# Altium footprint library Design III PCB Library.PcbLib: 89 footprints (part 6 of 6)
Each footprint in its own frame and in the unit in brackets; x right, y up, seen from the top. Pads: shape width x height; smd on the part's side, far side on the other; paste and mask are expansions set on the pad; w line width, h text height; cw(c..) or ccw(c..) is an arc to the next point about the centre after c.
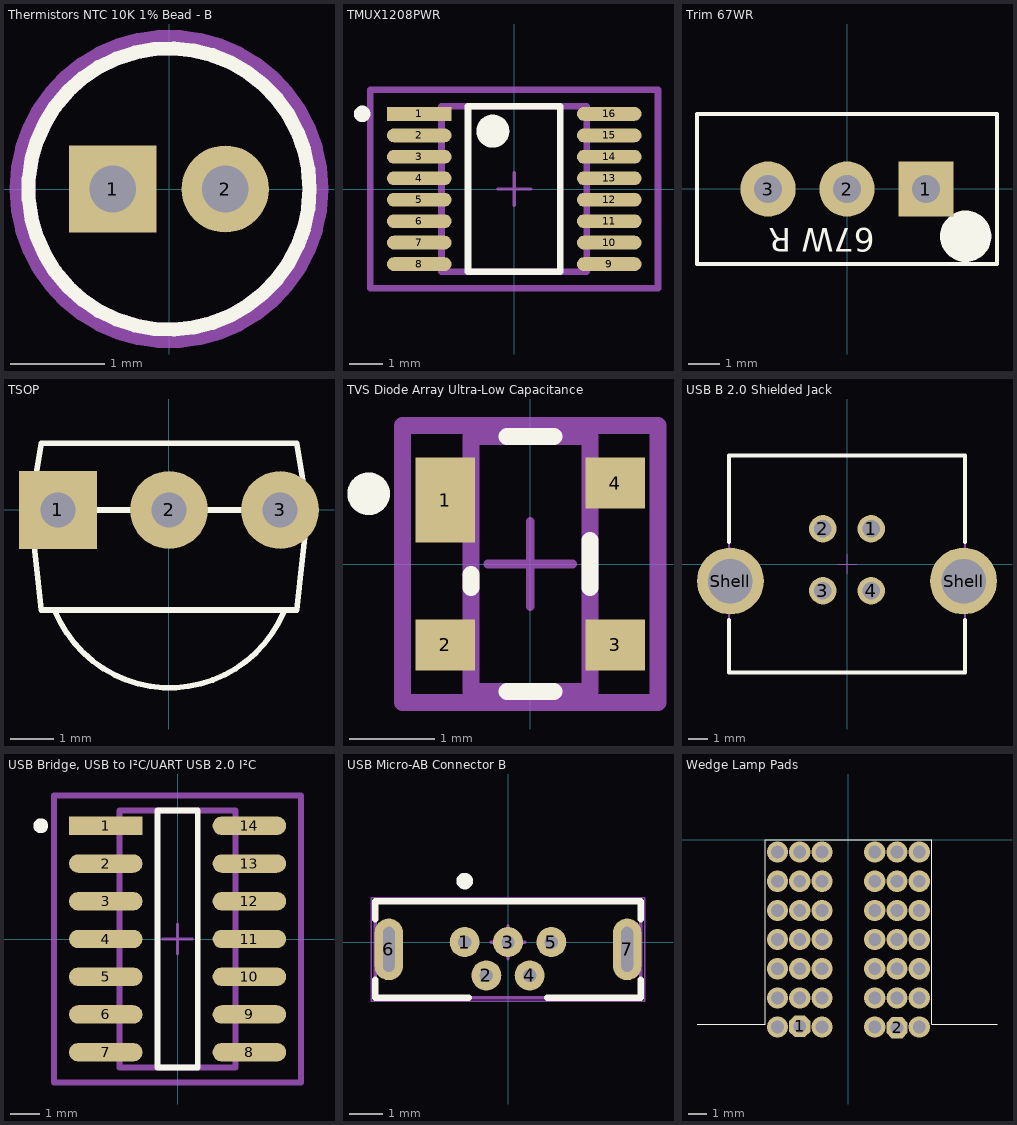
[diagram p5: the footprints below, top view; thin cyan lines are the x and y axes]

## Thermistors NTC 10K 1% Bead - B [mm] "NTC Thermistor 10k Bead, Epoxy"
pads (2):
  rect 0.93x0.93 hole 0.5 paste-1000 mask+0: 1(-0.6,0)
  round 0.93 hole 0.5 paste-1000 mask+0: 2(0.6,0)
Top Overlay:
  circle w0.15: c0,0 r1.5
Top 3D Body:
  circle w0.15: c0,0 r1.5
Top Courtyard:
  lines w0.2: -1.6,0 ccw(c0,0) 1.6,0 ccw(c0,0) -1.6,0

## TMUX1208PWR [mm] "5-V, 8: 1, 1-channel general-purpose analog multiplexer with 1.8-V input logic 16-TSSOP -40 to 125"
pads (16):
  rect 1.955x0.421 smd paste+0 mask+0: 1(-2.875,2.275)
  rrect100% 1.955x0.421 smd paste+0 mask+0: 2(-2.875,1.625) 3(-2.875,0.975) 4(-2.875,0.325) 5(-2.875,-0.325) 6(-2.875,-0.975) 7(-2.875,-1.625) 8(-2.875,-2.275) 9(2.875,-2.275) 10(2.875,-1.625) 11(2.875,-0.975) 12(2.875,-0.325) 13(2.875,0.325) 14(2.875,0.975) 15(2.875,1.625) 16(2.875,2.275)
Top Overlay:
  circle w0.5: c-0.648,1.75 r0.25
  circle w0.25: c-4.603,2.275 r0.125
  lines w0.2: -1.398,-2.5 1.398,-2.5 1.398,2.5 -1.398,2.5 -1.398,-2.5
Top Assembly:
  lines w0.2: -4.353,-3 4.353,-3 4.353,3 -4.353,3 -4.353,-3
Top Courtyard:
  lines w0.2: -4.353,-3 4.353,-3 4.353,3 -4.353,3 -4.353,-3
Board:
  lines w0.2: -2.2,-2.5 2.2,-2.5 2.2,2.5 -2.2,2.5 -2.2,-2.5
Top Component Center:
  lines w0.1: -0.5,0 0.5,0 ; 0,-0.5 0,0.5
3D body "IC_TEXAS_INSTRUMENTS_SN74HC165PWR_eec.STEP": height 0.25, standoff 0, extent -4.353,-3 4.353,3

## Trim 67WR [mil] "Trim 10T Vertical"
pads (3):
  rect 70x70 hole 35.4: 1(100,-0.29)
  round 70 hole 35.4: 2(0,-0.29) 3(-100,-0.29)
Top Overlay:
  circle w35: c150.32,-60.2 r15
  lines w5: -190,-95.29 -190,94.71 190,94.71 190,-95.29 -190,-95.29
  text "67W R" at 35,-50.29 h30
3D body: height 478, standoff 450, extent 110.32,-60.21 190.32,-50.21
3D body: height 476, standoff 6, extent 111.32,-94.13 189.01,-16.28
3D body: height 417, standoff 5, extent -190,-95.29 190,94.71

## TSOP [mil] "IR Sensor"
pads (3):
  rect 70x70 hole 31.5: 1(-99.75,-0.41)
  round 70 hole 31.5: 2(0.26,-0.41) 3(100.25,-0.41)
Top Overlay:
  lines w5: -102.19,-91.42 ccw(c0.81,-49.03) 103.65,-91.83 ; -124.74,-0.41 -62.24,-0.41 62.76,-0.41 125.26,-0.41 ; -124.74,-0.41 -114.74,-90.41 115.26,-90.41 125.26,-0.41 ; -124.74,-0.41 -114.74,59.59 115.26,59.59 125.26,-0.41
3D body: height 80, standoff -20, extent 85.28,-15.29 115.22,14.59
3D body: height 80, standoff -20, extent -14.72,-15.29 15.22,14.59
3D body: height 80, standoff -20, extent -114.72,-15.29 -84.78,14.59
3D body: height 290, standoff 110, extent -89.36,-159.47 89.87,19.59
3D body: height 330, standoff 50, extent -124.74,-90.41 125.26,59.59

## TVS Diode Array Ultra-Low Capacitance [mm] "Clamp Ipp Tvs Diode Surface Mount SOT-143B"
pads (4):
  rect 0.7x1 smd paste-1000 mask+0: 1(-1,0.75)
  rect 0.7x0.6 smd paste-1000 mask+0: 2(-1,-0.95) 3(1,-0.95) 4(1,0.95)
Top Overlay:
  circle w0.25: c-1.9,0.825 r0.125
  lines w0.2: -0.7,-0.275 -0.7,-0.125 ; -0.275,-1.5 0.275,-1.5 ; -0.275,1.5 0.275,1.5 ; 0.7,-0.275 0.7,0.275
Top Paste:
  rectangle: 0.7,0.7 1.3,1.2
  rectangle: 0.7,-1.2 1.3,-0.7
  rectangle: -1.3,-1.2 -0.7,-0.7
  rectangle: -1.3,0.3 -0.7,1.2
Top Assembly:
  lines w0.2: -1.5,-1.625 -1.5,1.625 1.5,1.625 1.5,-1.625 -1.5,-1.625
Top Courtyard:
  lines w0.2: -1.5,-1.625 -1.5,1.625 1.5,1.625 1.5,-1.625 -1.5,-1.625
Board:
  lines w0.2: -0.7,-1.5 -0.7,1.5 0.7,1.5 0.7,-1.5 -0.7,-1.5
Top Component Center:
  lines w0.1: -0.5,0 0.5,0 ; 0,-0.5 0,0.5
3D body "Trans_Nexperia_BCM62B_215_eec.STEP": height 0.25, standoff 0, extent -1.5,-1.625 1.5,1.625

## USB B 2.0 Shielded Jack [mm] "Straight PCB Mount Mount Female Type B USB Connector; 30 V ac; 1.5A"
pads (6):
  round 1.42 hole 0.92: 1(1.25,1.82) 2(-1.25,1.82) 3(-1.25,-1.38) 4(1.25,-1.38)
  round 3.45 hole 2.3: Shell(-6.02,-0.88) Shell(6.02,-0.88)
Top Overlay:
  lines w0.2: -6.1,-2.9 -6.1,-5.6 6.1,-5.6 6.1,-2.9 ; -6.1,1.14 -6.1,5.6 6.1,5.6 6.1,1.14
Mechanical 13:
  lines w0.1: -6.1,-5.6 -6.1,5.6 6.1,5.6 6.1,-5.6 -6.1,-5.6
Mechanical 15:
  lines w0.05: -0.5,0 0.5,0 ; 0,-0.5 0,0.5
3D body "61400413321.stp": height 16.14, standoff -4.18, extent -7.35,-5.6 7.35,5.6

## USB Bridge, USB to I²C/UART USB 2.0 I²C [mm] "USB Bridge, USB to I²C/UART USB 2.0 I²C, UART Interface 14-SOIC"
pads (14):
  rect 2.474x0.622 smd paste+0 mask+0: 1(-2.416,3.81)
  rrect100% 2.474x0.622 smd paste+0 mask+0: 2(-2.416,2.54) 3(-2.416,1.27) 4(-2.416,0) 5(-2.416,-1.27) 6(-2.416,-2.54) 7(-2.416,-3.81) 8(2.416,-3.81) 9(2.416,-2.54) 10(2.416,-1.27) 11(2.416,0) 12(2.416,1.27) 13(2.416,2.54) 14(2.416,3.81)
Top Overlay:
  circle w0.25: c-4.603,3.81 r0.125
  lines w0.2: -0.679,-4.325 -0.679,4.325 0.679,4.325 0.679,-4.325 -0.679,-4.325
Top Assembly:
  lines w0.2: -4.153,-4.825 -4.153,4.825 4.153,4.825 4.153,-4.825 -4.153,-4.825
Top Courtyard:
  lines w0.2: -4.153,-4.825 -4.153,4.825 4.153,4.825 4.153,-4.825 -4.153,-4.825
Board:
  lines w0.2: -1.95,-4.325 -1.95,4.325 1.95,4.325 1.95,-4.325 -1.95,-4.325
Top Component Center:
  lines w0.1: -0.5,0 0.5,0 ; 0,-0.5 0,0.5
3D body "IC_Microchip_MCP2221A-I-SL_eec.STEP": height 0.25, standoff 0, extent -4.153,-4.825 4.153,4.825

## USB Micro-AB Connector B [mm] "USB - Micro AB 2.0 Receptacle Connector 5 Position, Vertical, Through Hole with 2.30 mm (Standard) Shell Stakes, 5-Pin THD, RoHS, Tape and Reel"
pads (7):
  round 0.9 hole 0.4: 1(-1.3,0) 2(-0.65,-1) 3(0,0) 4(0.65,-1) 5(1.3,0)
  oval 0.85x1.85 hole 0.35 slot 1.35 at 90 deg: 6(-3.575,-0.22) 7(3.575,-0.22)
Top Overlay:
  circle w0.25: c-1.3,1.83 r0.125
  lines w0.2: -3.98,-1.128 -3.98,-1.67 -1.173,-1.67 ; -3.98,0.688 -3.98,1.23 3.98,1.23 3.98,0.688 ; 1.173,-1.67 3.98,-1.67 3.98,-1.128
Mechanical 13:
  lines w0.1: -3.98,-1.67 -3.98,1.23 3.98,1.23 3.98,-1.67 -3.98,-1.67
Mechanical 15:
  lines w0.05: -4.1,-1.77 -4.1,1.33 4.1,1.33 4.1,-1.77 -4.1,-1.77
  lines w0.1: -0.5,0 0.5,0 ; 0,-0.5 0,0.5
3D body "USB3106-30-0230-A_revB.step": height 5.61, standoff -2.3, extent -3.98,-1.684 3.98,1.251

## Wedge Lamp Pads [mil] "Wedge Lamp Socket"
pads (2):
  oct 46x46 hole 27.6: 1(-104.85,-403.18) 2(105.15,-406.18)
via 153.15,-404.68 diameter 46 hole 27.6
via 57.15,-404.68 diameter 46 hole 27.6
via -152.85,-404.68 diameter 46 hole 27.6
via -56.85,-404.68 diameter 46 hole 27.6
via 153.15,-341.68 diameter 46 hole 27.6
via 105.15,-341.68 diameter 46 hole 27.6
via 57.15,-341.68 diameter 46 hole 27.6
via -152.85,-341.68 diameter 46 hole 27.6
via -104.85,-341.68 diameter 46 hole 27.6
via -56.85,-341.68 diameter 46 hole 27.6
via 153.15,-278.68 diameter 46 hole 27.6
via 105.15,-278.68 diameter 46 hole 27.6
via 57.15,-278.68 diameter 46 hole 27.6
via -152.85,-278.68 diameter 46 hole 27.6
via -104.85,-278.68 diameter 46 hole 27.6
via -56.85,-278.68 diameter 46 hole 27.6
via 153.15,-215.68 diameter 46 hole 27.6
via 105.15,-215.68 diameter 46 hole 27.6
via 57.15,-215.68 diameter 46 hole 27.6
via -152.85,-215.68 diameter 46 hole 27.6
via -104.85,-215.68 diameter 46 hole 27.6
via -56.85,-215.68 diameter 46 hole 27.6
via 153.15,-152.68 diameter 46 hole 27.6
via 105.15,-152.68 diameter 46 hole 27.6
via 57.15,-152.68 diameter 46 hole 27.6
via -152.85,-152.68 diameter 46 hole 27.6
via -104.85,-152.68 diameter 46 hole 27.6
via -56.85,-152.68 diameter 46 hole 27.6
via 153.15,-89.68 diameter 46 hole 27.6
via 105.15,-89.68 diameter 46 hole 27.6
via 57.15,-89.68 diameter 46 hole 27.6
via -152.85,-89.68 diameter 46 hole 27.6
via -104.85,-89.68 diameter 46 hole 27.6
via -56.85,-89.68 diameter 46 hole 27.6
via -56.85,-26.68 diameter 46 hole 27.6
via -104.85,-26.68 diameter 46 hole 27.6
via -152.85,-26.68 diameter 46 hole 27.6
via 57.15,-26.68 diameter 46 hole 27.6
via 105.15,-26.68 diameter 46 hole 27.6
via 153.15,-26.68 diameter 46 hole 27.6
Top Overlay:
  lines w1: -326.85,-398.68 -179.85,-398.68 -179.85,0.32 180.15,0.32 180.15,-398.68 321.15,-398.68
Multi-Layer:
  region: 180.15,-398.18 180.15,-0.18 30.15,-0.18 30.15,-398.18
  region: -29.85,-398.18 -29.85,-0.18 -179.85,-0.18 -179.85,-398.18